# Altium footprint library CUSTOM PCB.PcbLib: 404 footprints (part 26 of 26)
Each footprint in its own frame and in the unit in brackets; x right, y up, seen from the top. Pads: shape width x height; smd on the part's side, far side on the other; paste and mask are expansions set on the pad; w line width, h text height; cw(c..) or ccw(c..) is an arc to the next point about the centre after c.
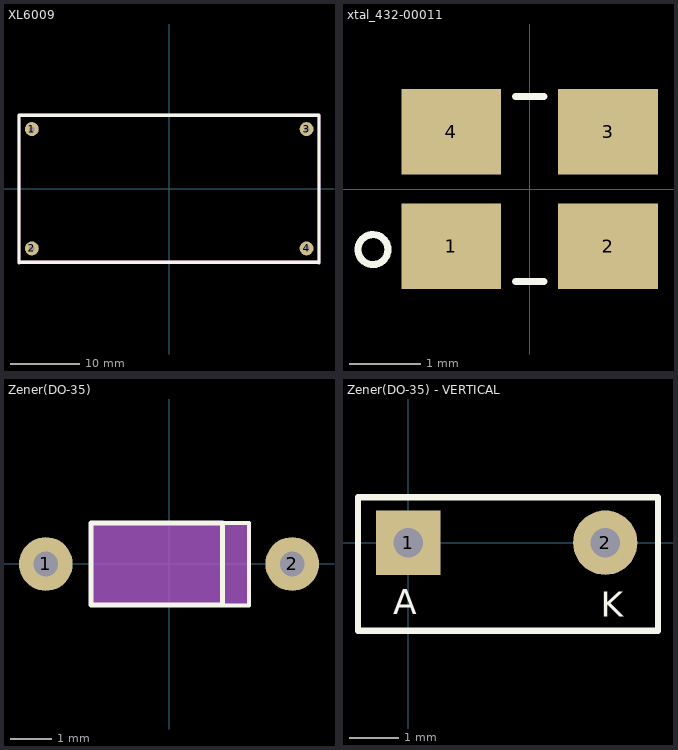
[diagram p25: the footprints below, top view; thin cyan lines are the x and y axes]

## XL6009 [mm]
pads (4):
  round 2 hole 0.8: 1(-19.748,8.572) 2(-19.748,-8.572) 3(19.748,8.572) 4(19.748,-8.572)
Top Overlay:
  lines w0.5: -21.59,-10.617 -21.59,10.008 -21.59,0 ; 21.539,-10.617 21.539,10.008 ; -21.59,-10.541 -21.59,10.541 0,10.541 21.539,10.541 21.539,-10.541 0,-10.541 -21.59,-10.541
Mechanical 1:
  lines w0.5: -21.59,-10.617 -21.59,10.008 -21.59,0 ; 21.539,-10.617 21.539,10.008 ; -21.59,-10.541 -21.59,10.541 0,10.541 21.539,10.541 21.539,-10.541 0,-10.541 -21.59,-10.541
3D body: height 6, standoff 0, extent -21.59,-10.617 21.539,10.541

## xtal_432-00011 [mm]
pads (4):
  rect 1.4x1.2 smd: 1(-1.1,-0.8) 2(1.1,-0.8) 3(1.1,0.8) 4(-1.1,0.8)
Top Overlay:
  circle w0.1: c-2.2,-0.85 r0.21
  lines w0.1: -0.2,-1.3 0.2,-1.3 ; -0.2,1.3 0.2,1.3
3D body "User Library-Crystal TXC Corp 7M series.x_t": height 0.8, standoff 0, extent -1.65,-1.3 1.65,1.3

## Zener(DO-35) [mm]
pads (2):
  round 1.308 hole 0.6: 1(-3,0) 2(3,0)
Top Overlay:
  lines w0.1: 1.3,-1.016 1.953,-1.016 1.953,1 1.3,1
  lines w0.127: -1.9,-1 -1.9,1 1.3,1 1.3,-1 -1.9,-1
Mechanical 16:
  region: 1.905,-1.017 -1.908,-1.017 -1.908,1.016 1.905,1.016

## Zener(DO-35) - VERTICAL [mm]
pads (2):
  rect 1.308x1.308 hole 0.6: 1(0,0)
  round 1.308 hole 0.6: 2(4,0)
Top Overlay:
  lines w0.127: -1.016,-1.786 5.07,-1.786 5.07,0.922 -1.016,0.922 -1.016,-1.786
  text "K" at 3.912,-1.499 h0.51
  text "A" at -0.305,-1.448 h0.51
3D body "ZENER DO-35 VERTICAL.step": height 6.25, standoff -3.5, extent -0.751,-0.751 4.25,0.751